# Altium footprint library Cyberdeck.PcbLib: 261 footprints (part 13 of 17)
Each footprint in its own frame and in the unit in brackets; x right, y up, seen from the top. Pads: shape width x height; smd on the part's side, far side on the other; paste and mask are expansions set on the pad; w line width, h text height; cw(c..) or ccw(c..) is an arc to the next point about the centre after c.
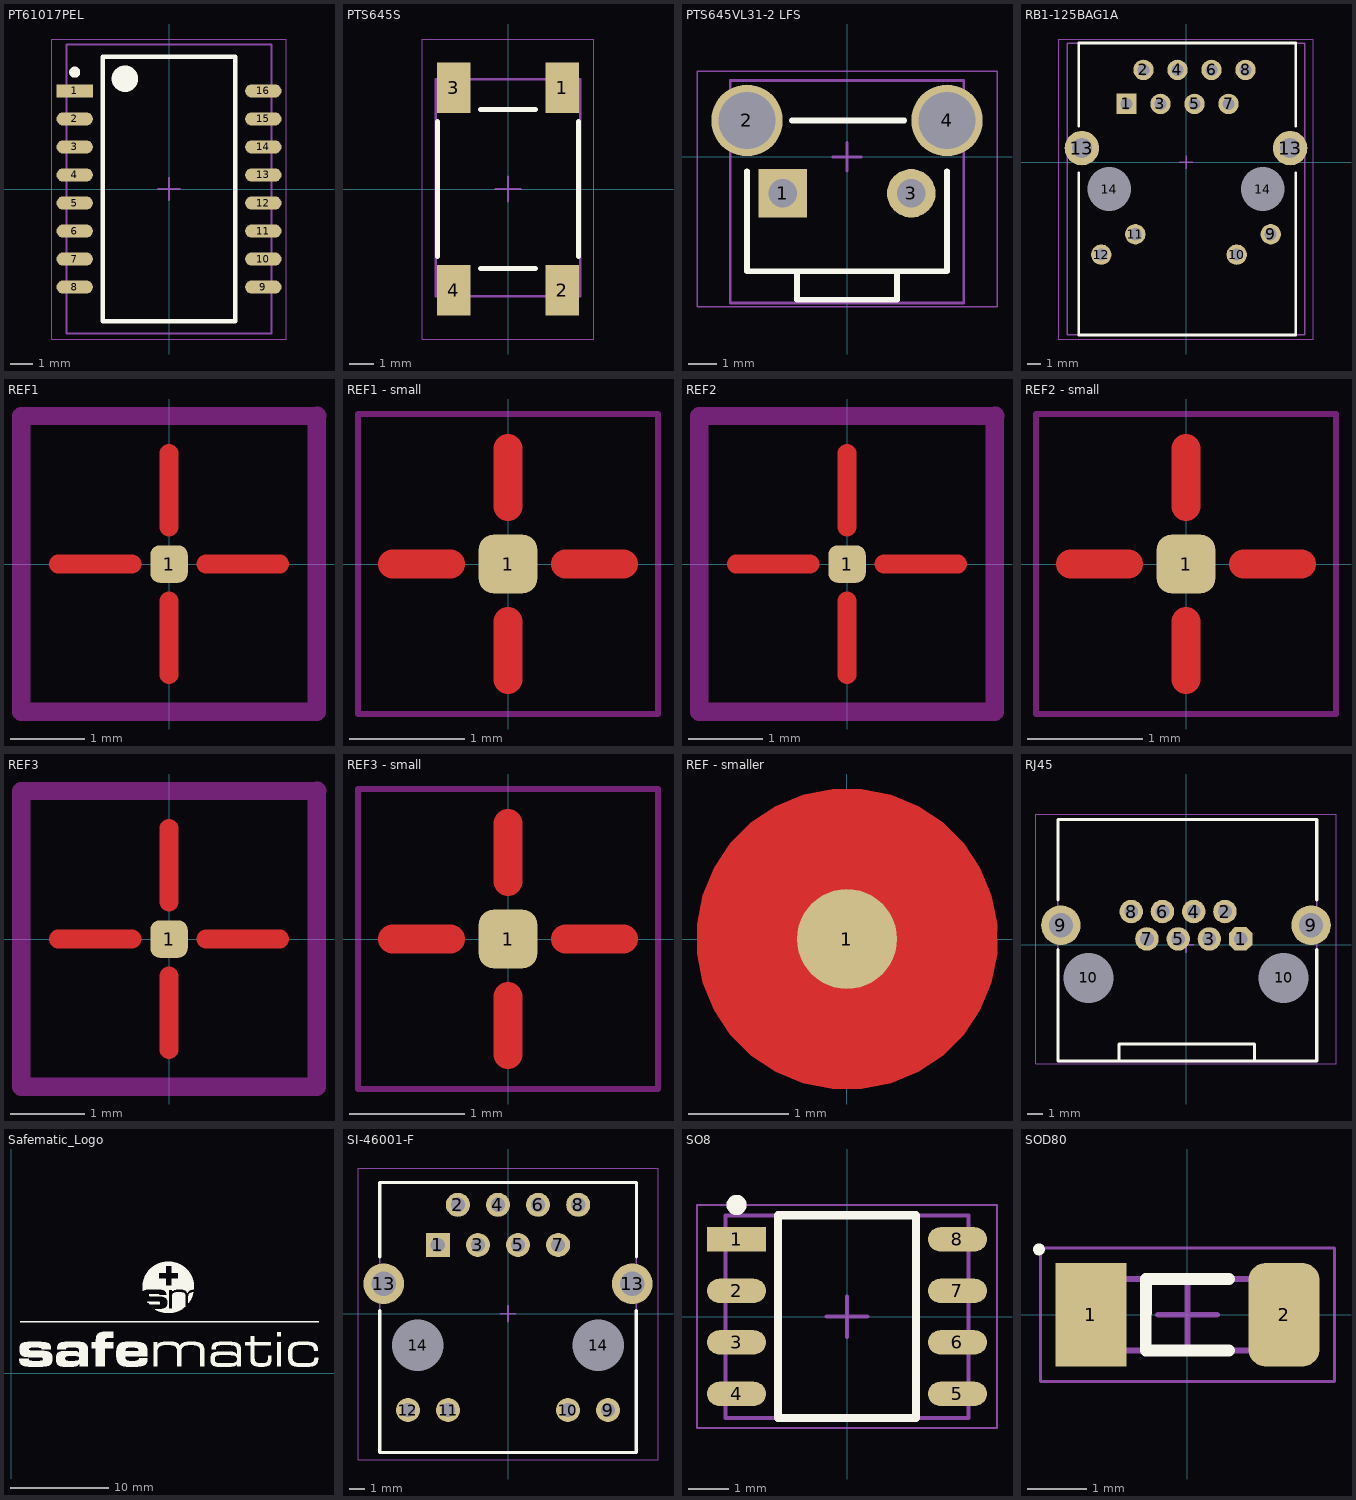
[diagram p12: the footprints below, top view; thin cyan lines are the x and y axes]

## PT61017PEL [mm] "PT61017PEL"
height 5.65
pads (16):
  rect 1.65x0.6 smd: 1(-4.275,4.445)
  oval 1.65x0.6 smd: 2(-4.275,3.175) 3(-4.275,1.905) 4(-4.275,0.635) 5(-4.275,-0.635) 6(-4.275,-1.905) 7(-4.275,-3.175) 8(-4.275,-4.445) 9(4.275,-4.445) 10(4.275,-3.175) 11(4.275,-1.905) 12(4.275,-0.635) 13(4.275,0.635) 14(4.275,1.905) 15(4.275,3.175) 16(4.275,4.445)
Top Overlay:
  circle w0.6: c-2,5 r0.3
  circle w0.25: c-4.275,5.295 r0.125
  lines w0.2: -3,-6 3,-6 3,6 -3,6 -3,-6
Assembly Top:
  lines w0.1: -4.65,-6.55 4.65,-6.55 4.65,6.55 -4.65,6.55 -4.65,-6.55
Courtyard Top:
  lines w0.05: -5.325,-6.8 5.325,-6.8 5.325,6.8 -5.325,6.8 -5.325,-6.8
  lines w0.1: -0.5,0 0.5,0 ; 0,-0.5 0,0.5
3D body "PT61017PEL.step": height 5.65, standoff 0, extent -4.65,-6.55 4.65,6.55

## PTS645S [mm] "PTS645S  SWITCH TACTILE SPST-NO"
height 9.5
pads (4):
  rect 1.4x2.1 smd: 1(2.25,4.2) 2(2.25,-4.2) 3(-2.25,4.2) 4(-2.25,-4.2)
Top Overlay:
  lines w0.2: -2.921,-2.8 -2.921,2.8 ; -1.143,-3.302 1.143,-3.302 ; -1.143,3.302 1.143,3.302 ; 2.921,-2.8 2.921,2.8
Assembly Top:
  lines w0.1: -3,4.55 -3,-4.45 3,-4.45 ; -3,4.55 -3,4.55 ; -3,4.55 3,4.55 3,-4.45 ; 3,-4.45 3,-4.45
Courtyard Top:
  lines w0.05: -3.556,-6.223 3.556,-6.223 3.556,6.223 -3.556,6.223 -3.556,-6.223
  lines w0.1: -0.5,0 0.5,0 ; 0,-0.5 0,0.5
3D body "User Library-PTS645SL43SMTR92-LFS.STEP": height 4.3, standoff 0, extent -3,-4.45 3,4.55

## PTS645VL31-2 LFS [mm] "PTS645VL31-2 LFS"
height 7
pads (4):
  rect 1.7x1.7 hole 1: 1(-2.25,-1.275)
  round 2.5 hole 2: 2(-3.5,1.275) 4(3.5,1.275)
  round 1.7 hole 1: 3(2.25,-1.275)
Top Overlay:
  lines w0.2: -3.5,-0.5 -3.5,-4 3.5,-4 3.5,-0.5 ; -1.925,1.275 2,1.275 ; -1.75,-4 -1.75,-5 1.75,-5 1.75,-4
Assembly Top:
  lines w0.1: -4.086,-5.12 -4.086,2.675 4.086,2.675 4.086,-5.12 -4.086,-5.12
Courtyard Top:
  lines w0.05: -5.25,-5.25 5.25,-5.25 5.25,3 -5.25,3 -5.25,-5.25
  lines w0.1: -0.5,0 0.5,0 ; 0,-0.5 0,0.5
3D body "User Library-pts645-v-l-39.STEP": height 7.11, standoff -3.49, extent -4.086,-5.12 4.086,2.675

## RB1-125BAG1A [mm] "CONN MAGJACK 1PORT 100 BASE-T"
height 17.02
pads (16):
  rect 1.524x1.524 hole 0.9: 1(-4.445,4.35)
  round 1.524 hole 0.9: 2(-3.175,6.89) 3(-1.905,4.35) 4(-0.635,6.89) 5(0.635,4.35) 6(1.905,6.89) 7(3.175,4.35) 8(4.445,6.89) 9(6.325,-5.38) 10(3.785,-6.9) 11(-3.785,-5.38) 12(-6.325,-6.9)
  round 2.57 hole 1.5: 13(-7.775,1.05) 13(7.775,1.05)
  round 1.524 hole 3.25 unplated: 14(-5.715,-2) 14(5.715,-2)
Top Overlay:
  lines w0.2: -8,-0.8 -8,-12.9 8.2,-12.9 8.2,-0.8 ; -8,2.7 -8,8.9 8.2,8.9 8.2,2.7
Assembly Top:
  lines w0.1: -8.875,-12.9 8.875,-12.9 8.875,8.9 -8.875,8.9 -8.875,-12.9
Courtyard Top:
  lines w0.05: -9.5,-13.2 9.5,-13.2 9.5,9.2 -9.5,9.2 -9.5,-13.2
  lines w0.1: 0,-0.5 0,0.5 ; -0.5,0 0.5,0 -0.5,0
3D body: height 8.6, standoff -3, extent -19.1,2.3 -19.1,2.3
3D body "RB1-125BAG1A--3DModel-STEP-56544.STEP": height 14.36, standoff -3.34, extent -8.875,-12.88 8.875,8.9

## REF1 [mil]
pads (1):
  rrect50% 20x20 smd: 1(0,0)
Top Layer:
  lines w10: -59.06,0 -19.68,0 ; 0,-59.06 0,-19.69 ; 0,19.68 0,59.06 ; 19.69,0 59.06,0
  text "1" at 39.37,-59.06 h32
Top Layer keep-out:
  lines w10: 78.74,78.74 78.74,-78.74 -78.74,-78.74 -78.74,78.74 79,79
Top Solder:
  region: -80,80 -80,-80 80,-80 80,80

## REF1 - small [mil]
pads (1):
  rrect50% 20x20 smd: 1(0,0)
Top Layer:
  lines w10: -39.37,0 -19.68,0 ; 0,-39.37 0,-19.69 ; 0,19.68 0,39.37 ; 19.69,0 39.37,0
  text "1" at 23.62,-41.34 h23.62
Top Solder:
  region: -51.18,51.18 -51.18,-51.18 51.18,-51.18 51.18,51.18
Keep-Out Layer:
  lines w1.97: -51.18,-51.18 -51.18,51.18 51.18,51.18 51.18,-51.18 -51.18,-51.18

## REF2 [mil]
pads (1):
  rrect50% 20x20 smd: 1(0,0)
Top Layer:
  lines w10: -59.06,0 -19.68,0 ; 0,-59.06 0,-19.69 ; 0,19.68 0,59.06 ; 19.69,0 59.06,0
  text "2" at 39.37,-59.06 h32
Top Layer keep-out:
  lines w10: 78.74,78.74 78.74,-78.74 -78.74,-78.74 -78.74,78.74 79,79
Top Solder:
  region: -80,80 -80,-80 80,-80 80,80

## REF2 - small [mil]
pads (1):
  rrect50% 20x20 smd: 1(0,0)
Top Layer:
  lines w10: -39.37,0 -19.68,0 ; 0,-39.37 0,-19.69 ; 0,19.68 0,39.37 ; 19.69,0 39.37,0
  text "2" at 23.62,-41.34 h23.62
Top Solder:
  region: -51.18,51.18 -51.18,-51.18 51.18,-51.18 51.18,51.18
Keep-Out Layer:
  lines w1.97: -51.18,-51.18 -51.18,51.18 51.18,51.18 51.18,-51.18 -51.18,-51.18

## REF3 [mil]
pads (1):
  rrect50% 20x20 smd: 1(0,0)
Top Layer:
  lines w10: -59.06,0 -19.68,0 ; 0,-59.06 0,-19.68 ; 0,19.69 0,59.06 ; 19.68,0 59.06,0
  text "3" at 39.37,-59.06 h32
Top Layer keep-out:
  lines w10: 78.74,78.74 78.74,-78.74 -78.74,-78.74 -78.74,78.74 79,79
Top Solder:
  region: -80,80 -80,-80 80,-80 80,80

## REF3 - small [mil]
pads (1):
  rrect50% 20x20 smd: 1(0,0)
Top Layer:
  lines w10: -39.37,0 -19.68,0 ; 0,-39.37 0,-19.69 ; 0,19.68 0,39.37 ; 19.69,0 39.37,0
  text "3" at 23.62,-41.34 h23.62
Top Solder:
  region: -51.18,51.18 -51.18,-51.18 51.18,-51.18 51.18,51.18
Keep-Out Layer:
  lines w1.97: -51.18,-51.18 -51.18,51.18 51.18,51.18 51.18,-51.18 -51.18,-51.18

## REF - smaller [mm]
pads (1):
  round 1 smd paste+0 mask+1: 1(0,0)
Top Layer:
  pour cut-out: 0,-1.5 -0.148,-1.5 -0.438,-1.442 -0.711,-1.329 -0.956,-1.165 -1.165,-0.956 -1.329,-0.711 -1.442,-0.438 -1.5,-0.148 -1.5,0 -1.5,0.148 -1.442,0.438 -1.329,0.71 -1.165,0.956 -0.956,1.165 -0.711,1.329 -0.438,1.442 -0.148,1.5 0,1.5 0.148,1.5 0.438,1.442 0.711,1.329 0.956,1.165 1.165,0.956 1.329,0.711 1.442,0.438 1.5,0.148 1.5,0 1.5,-0.148 1.442,-0.438 1.329,-0.71 1.165,-0.956 0.956,-1.165 0.711,-1.329 0.438,-1.442 0.148,-1.5

## RJ45 [mm] "generic RJ45 footprint w/o LEDs"
height 13.5
pads (12):
  oct 1.524x1.524 hole 0.89: 1(3.55,0.38)
  round 1.524 hole 0.89: 2(2.53,2.16) 3(1.52,0.38) 4(0.5,2.16) 5(-0.51,0.38) 6(-1.53,2.16) 7(-2.54,0.38) 8(-3.56,2.16)
  round 2.57 hole 1.57: 9(-8.13,1.27) 9(8.13,1.27)
  round 1.524 hole 3.25 unplated: 10(-6.35,-2.16) 10(6.35,-2.16)
Top Overlay:
  lines w0.2: -8.325,-0.325 -8.325,-7.56 8.5,-7.56 8.5,-0.325 ; -8.325,2.925 -8.325,8.14 8.5,8.14 8.5,2.925 ; -4.35,-7.56 -4.35,-6.46 4.45,-6.46 4.45,-7.46
Assembly Top:
  lines w0.1: -8.33,-7.61 8.5,-7.61 ; -8.33,-7.61 -8.33,-7.609 ; -8.33,-7.609 -8.33,8.14 8.5,8.14 ; 8.5,-7.61 8.5,8.14 ; 8.5,-7.61 8.5,-7.61 ; 8.5,8.14 8.5,8.14
Courtyard Top:
  lines w0.05: -9.75,-7.75 -9.75,8.5 9.75,8.5 9.75,-7.75 -9.75,-7.75
  lines w0.1: -0.5,0 0.5,0 ; 0,-0.5 0,0.5
3D body "M-RJHSE-5E80-REVT1.STEP": height 13.47, standoff -3.77, extent -8.331,-7.61 8.5,8.14
3D body "M-RJHSE-5E80-REVT1.STEP": height 13.47, standoff -3.77, extent -8.326,-7.605 8.504,8.145

## Safematic_Logo [mm] "Logo"
Top Overlay:
  drawing of 931 lines, arcs and shapes, not listed
Top Solder:
  drawing of 163 lines, arcs and shapes, not listed

## SI-46001-F [mm] "CONN MAGJACK 1PORT 100 BASE-T"
height 17.02
pads (16):
  rect 1.524x1.524 hole 0.9: 1(-4.445,4.35)
  round 1.524 hole 0.9: 2(-3.175,6.89) 3(-1.905,4.35) 4(-0.635,6.89) 5(0.635,4.35) 6(1.905,6.89) 7(3.175,4.35) 8(4.445,6.89) 9(6.335,-6.11) 10(3.795,-6.11) 11(-3.795,-6.11) 12(-6.335,-6.11)
  round 2.57 hole 1.57: 13(-7.875,1.89) 13(7.875,1.89)
  round 1.524 hole 3.25 unplated: 14(-5.715,-2) 14(5.715,-2)
Top Overlay:
  lines w0.2: -8.125,0.2 -8.125,-8.8 8.125,-8.8 8.125,0.2 ; -8.125,3.6 -8.125,8.3 8.128,8.3 8.128,3.6
Assembly Top:
  lines w0.1: -8.125,-8.8 -8.125,8.3 8.128,8.3 8.128,-8.8 -8.125,-8.8
Courtyard Top:
  lines w0.05: -9.5,-9.25 -9.5,9.2 9.5,9.2 9.5,-9.25 -9.5,-9.25
  lines w0.1: 0,-0.5 0,0.5 ; -0.5,0 0.5,0 -0.5,0
3D body "SI-46001-F--3DModel-STEP-56544.STEP": height 17.03, standoff -4.43, extent -8.128,-8.759 8.128,8.259

## SO8 [mm] "SOIC8, SO8, PG-DSO8-44, R-PDSO8-G8"
height 1.75
pads (8):
  rect 1.45x0.6 smd: 1(-2.725,1.905)
  oval 1.45x0.6 smd: 2(-2.725,0.635) 3(-2.725,-0.635) 4(-2.725,-1.905) 5(2.725,-1.905) 6(2.725,-0.635) 7(2.725,0.635) 8(2.725,1.905)
Top Overlay:
  circle w0.25: c-2.725,2.755 r0.125
  lines w0.2: -1.7,-2.5 -1.7,2.5 1.7,2.5 1.7,-2.5 -1.7,-2.5
Assembly Top:
  lines w0.1: -3,-2.5 -3,2.5 3,2.5 3,-2.5 -3,-2.5
Courtyard Top:
  lines w0.05: -3.7,-2.75 -3.7,2.75 3.7,2.75 3.7,-2.75 -3.7,-2.75
  lines w0.1: -0.5,0 0.5,0 ; 0,-0.5 0,0.5
3D body "SO8.step": height 1.75, standoff 0, extent -3,-2.5 3,2.5

## SOD80 [mm] "MELF Diode, 2-Leads, Body 3.45x1.30mm, IPC Medium Density"
height 1.2
pads (2):
  rect 1.2x1.75 smd: 1(-1.625,0)
  rrect50% 1.2x1.75 smd: 2(1.625,0)
Top Overlay:
  circle w0.1: c-2.5,1.1 r0.05
  lines w0.2: -0.7,0.6 -0.702,-0.6 ; 0.7,-0.6 -0.702,-0.6 ; 0.7,0.6 -0.702,0.6 -0.702,-0.6
Assembly Top:
  lines w0.1: -1.725,-0.6 -1.725,0.6 1.725,0.6 1.725,-0.6 -1.725,-0.6
Courtyard Top:
  lines w0.05: -2.475,-1.125 -2.475,1.125 2.475,1.125 2.475,-1.125 -2.475,-1.125
  lines w0.1: -0.5,0 0.5,0 ; 0,-0.5 0,0.5
3D body "SOD80.step": height 1.3, standoff 0.01, extent -1.725,-0.649 1.725,0.649